# Altium footprint library 5ko.PcbLib: 126 footprints (part 6 of 8)
Each footprint in its own frame and in the unit in brackets; x right, y up, seen from the top. Pads: shape width x height; smd on the part's side, far side on the other; paste and mask are expansions set on the pad; w line width, h text height; cw(c..) or ccw(c..) is an arc to the next point about the centre after c.
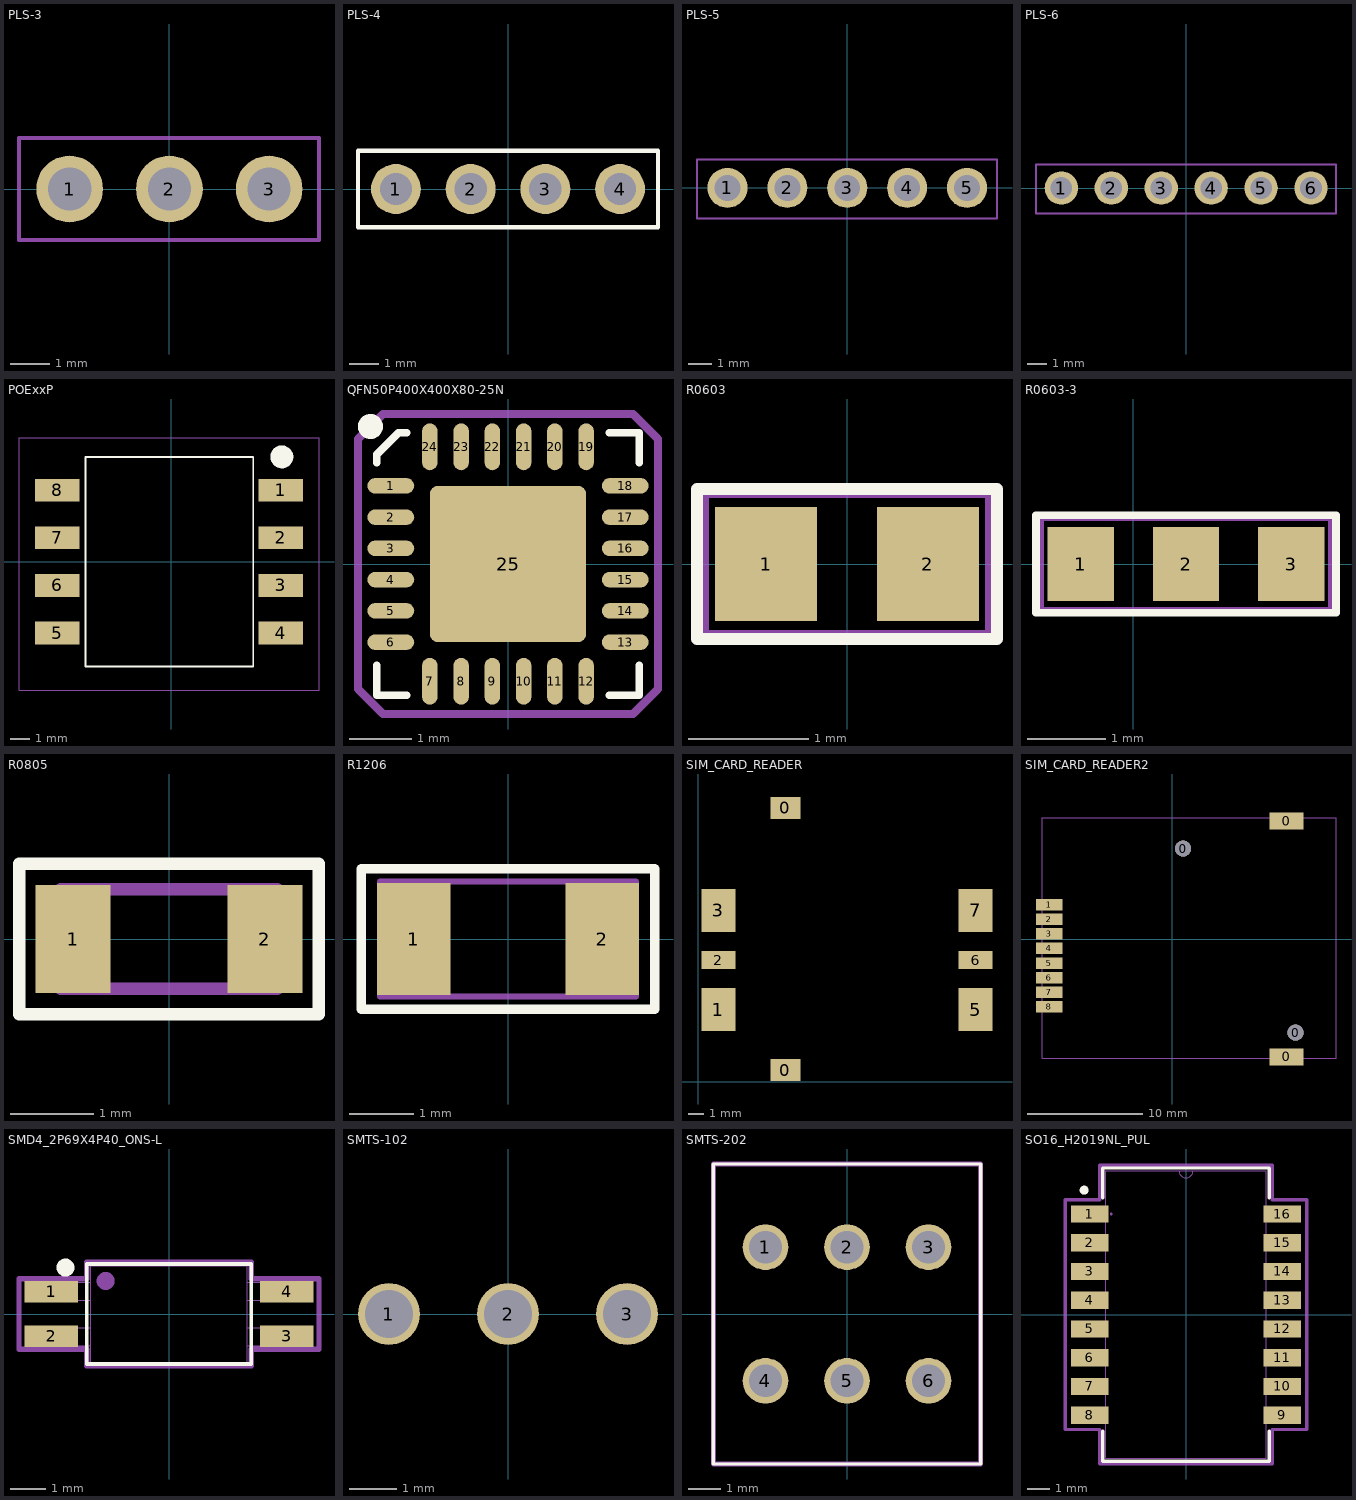
[diagram p5: the footprints below, top view; thin cyan lines are the x and y axes]

## PLS-3 [mm]
pads (3):
  round 1.7 hole 1.1: 1(-2.54,0) 2(0,0) 3(2.54,0)
Mechanical 15:
  lines w0.1: -3.83,-1.3 -3.83,1.3 3.81,1.3 3.81,-1.3 -3.83,-1.3
  text ".Designator" at -1.905,-0.127 h0.5
3D body "User Library-PLS-3.step": height 8.54, standoff -3, extent -3.81,-1.27 3.81,1.27

## PLS-4 [mm]
pads (4):
  round 1.7 hole 1.1: 1(-3.81,0) 2(-1.27,0) 3(1.27,0) 4(3.81,0)
Top Overlay:
  lines w0.15: -5.1,-1.3 5.1,-1.3 5.1,1.3 -5.1,1.3 -5.1,-1.3
Mechanical 15:
  lines w0.1: -5.1,-1.3 5.1,-1.3 5.1,1.3 -5.1,1.3 -5.1,-1.3
  text ".Designator" at -1.7,-0.1 h0.5
3D body "PLS-4.STEP": height 9.2, standoff -3.5, extent -5.08,-1.27 5.08,1.27

## PLS-5 [mm]
pads (5):
  round 1.7 hole 1.1: 1(-5.08,0) 2(-2.54,0) 3(0,0) 4(2.54,0) 5(5.08,0)
Mechanical 15:
  lines w0.1: -6.37,-1.3 -6.37,1.2 6.35,1.2 6.35,-1.3 -6.37,-1.3
  text ".Designator" at -0.889,-0.127 h0.5
3D body "User Library-PLS-5.step": height 8.54, standoff -3, extent -6.35,-1.27 6.35,1.27

## PLS-6 [mm]
pads (6):
  round 1.7 hole 1.1: 1(-6.35,0) 2(-3.81,0) 3(-1.27,0) 4(1.27,0) 5(3.81,0) 6(6.35,0)
Mechanical 15:
  lines w0.1: -7.64,-1.3 7.62,-1.3 7.62,1.2 -7.64,1.2 -7.64,-1.3
  text ".Designator" at -2.159,-0.127 h0.5
3D body "User Library-PLS-6-1.step": height 8.54, standoff -3, extent -7.62,-1.27 7.62,1.27

## POExxP [mm]
height 10
pads (8):
  rect 2.335x1.19 smd: 1(5.75,3.75) 2(5.75,1.25) 3(5.75,-1.25) 4(5.75,-3.75) 5(-6,-3.75) 6(-6,-1.25) 7(-6,1.25) 8(-6,3.75)
Top Overlay:
  circle w0.6: c5.8,5.5 r0.3
  lines w0.1: -4.5,-5.5 4.3,-5.5 4.3,5.5 -4.5,5.5 -4.5,-5.5
Mechanical 15:
  lines w0.05: -8,-6.75 -8,6.5 7.75,6.5 7.75,-6.75 -8,-6.75
3D body "Coilcraft-POE30P-50L.step": height 8.97, standoff -0.05, extent -6.6,-5.46 6.6,5.46

## QFN50P400X400X80-25N [mm] "QFN, 24-Leads with exposed die pad, Body 4.05x4.05mm (max), Pitch 0.50mm, IPC Medium Density"
height 0.8
pads (25):
  oval 0.75x0.25 smd mask+0.075: 1(-1.875,1.25) 2(-1.875,0.75) 3(-1.875,0.25) 4(-1.875,-0.25) 5(-1.875,-0.75) 6(-1.875,-1.25) 13(1.875,-1.25) 14(1.875,-0.75) 15(1.875,-0.25) 16(1.875,0.25) 17(1.875,0.75) 18(1.875,1.25)
  oval 0.25x0.75 smd mask+0.075: 7(-1.25,-1.875) 8(-0.75,-1.875) 9(-0.25,-1.875) 10(0.25,-1.875) 11(0.75,-1.875) 12(1.25,-1.875) 19(1.25,1.875) 20(0.75,1.875) 21(0.25,1.875) 22(-0.25,1.875) 23(-0.75,1.875) 24(-1.25,1.875)
  rrect10% 2.5x2.5 smd: 25(0,0)
Top Overlay:
  circle w0.2: c-2.2,2.2 r0.1
  lines w0.127: -2.1,-1.625 -2.1,-2.1 -1.625,-2.1 ; -2.1,1.625 -2.1,1.75 -1.75,2.1 -1.625,2.1 ; 1.625,-2.1 2.1,-2.1 2.1,-1.625 ; 1.625,2.1 2.1,2.1 2.1,1.625
Mechanical 15:
  lines w0.127: -2.4,-2 -2.4,2 -2,2.4 2,2.4 2.4,2 2.4,-2 2,-2.4 -2,-2.4 -2.4,-2
3D body "QFN50P400X400X80-25N.STEP": height 0.8, standoff 0, extent -2.045,-2.045 2.045,2.045

## R0603 [mm]
pads (2):
  rect 0.85x0.95 smd: 1(-0.675,0) 2(0.675,0)
Top Overlay:
  lines w0.1: -1.25,-0.625 -1.25,0.625 1.25,0.625 1.25,-0.625 -1.25,-0.625
Mechanical 15:
  lines w0.1: -1.2,-0.6 -1.2,0.6 1.2,0.6 1.2,-0.6 -1.2,-0.6
  text ".Designator" at -0.9,-0.1 h0.3
3D body "RES0603.step": height 0.45, standoff 0, extent -0.8,-0.4 0.8,0.4

## R0603-3 [mm]
pads (3):
  rect 0.85x0.95 smd: 1(-0.675,0) 2(0.675,0) 3(2.025,0)
Top Overlay:
  lines w0.1: -1.25,-0.625 -1.25,0.625 2.6,0.625 2.6,-0.625 -1.25,-0.625
Mechanical 15:
  lines w0.1: -1.2,-0.6 -1.2,0.6 2.55,0.6 2.55,-0.6 -1.2,-0.6
  text ".Designator" at 0.025,-0.1 h0.3
3D body "RES0603.step": height 0.45, standoff 0, extent -0.8,-0.4 0.8,0.4

## R0805 [mm]
height 1.45
pads (2):
  rect 0.9x1.3 smd: 1(-1.15,0) 2(1.15,0)
Top Overlay:
  lines w0.15: -1.8,-0.9 -1.8,0.9 1.8,0.9 1.8,-0.9 -1.8,-0.9
Mechanical 15:
  lines w0.15: -1.3,-0.6 1.3,-0.6 1.3,0.6 -1.3,0.6 -1.3,-0.6
  text ".Designator" at -0.9,-0.1 h0.3
3D body "User Library-User Library-0805_Res1.step": height 0.8, standoff 0, extent -1.4,-0.625 1.4,0.625

## R1206 [mm]
pads (2):
  rect 1.15x1.75 smd: 1(-1.475,0) 2(1.475,0)
Top Overlay:
  lines w0.15: -2.3,-1.1 2.3,-1.1 2.3,1.1 -2.3,1.1 -2.3,-1.1
Mechanical 15:
  lines w0.1: -2,-0.9 -2,0.9 2,0.9 2,-0.9 -2,-0.9
  text ".Designator" at -1.7,-0.1 h0.5
3D body "RES1206-2.step": height 0.55, standoff 0, extent -1.505,-0.775 1.505,0.775

## SIM_CARD_READER [mm]
pads (8):
  rect 1.95x1.45 smd: 0(5.69,0.755) 0(5.69,17.885)
  rect 2.2x2.8 smd: 1(1.31,4.705) 3(1.31,11.185) 5(18.11,4.705) 7(18.11,11.185)
  rect 2.2x1.2 smd: 2(1.31,7.945) 6(18.11,7.945)
3D body "SIM1.stp": height 1.9, standoff -0.1, extent 0.2,0.25 25.72,18.35

## SIM_CARD_READER2 [mm]
pads (12):
  round 1.4 hole 1.4 unplated: 0(0.935,7.885) 0(10.735,-8.165)
  rect 2.95x1.5 smd: 0(9.965,-10.275) 0(9.965,10.275)
  rect 2.3x1 smd: 1(-10.735,2.985) 2(-10.735,1.715) 3(-10.735,0.445) 4(-10.735,-0.825) 5(-10.735,-2.095) 6(-10.735,-3.365) 7(-10.735,-4.635) 8(-10.735,-5.905)
Mechanical 15:
  lines w0.1: -11.335,-10.415 -11.335,10.585 14.265,10.585 14.265,-10.415 -11.335,-10.415
  text ".Designator" at -0.935,-0.215 h0.5
3D body "SIM2.stp": height 1.94, standoff -0.56, extent -11.335,-10.39 15.165,10.56

## SMD4_2P69X4P40_ONS-L [mm]
height 1
pads (4):
  rect 1.5x0.6 smd paste+0 mask+0: 1(-3.3,0.625) 2(-3.3,-0.625) 3(3.3,-0.625) 4(3.3,0.625)
Top Overlay:
  circle w0.25: c-2.9,1.3 r0.125
  lines w0.1: -2.3,-1.4 -2.3,1.4 -2.2,1.4 2.3,1.4 2.3,-1.4 -2.3,-1.4
Mechanical 13:
  circle w0.25: c-1.775,0.925 r0.125
  lines w0.025: -2.197,0.381 -3.645,0.381 -3.645,0.889 -2.197,0.889 ; -3.645,-0.889 -2.197,-0.889 -2.197,-0.381 -3.645,-0.381 -3.645,-0.889 ; -2.197,-1.346 -2.197,1.346 2.197,1.346 2.197,-1.346 -2.197,-1.346 ; 2.197,-0.889 3.645,-0.889 3.645,-0.381 2.197,-0.381 2.197,-0.889 ; 2.197,0.381 3.645,0.381 3.645,0.889 2.197,0.889 2.197,0.381
Mechanical 15:
  lines w0.152: -4.2,-0.991 -2.299,-0.991 -2.299,-1.448 2.299,-1.448 2.299,-0.991 4.2,-0.991 4.2,0.991 2.299,0.991 2.299,1.448 -2.299,1.448 -2.299,0.991 -4.2,0.991 -4.2,-0.991
3D body "SMD4_2P69X4P40_ONS.step": height 2.39, standoff 0, extent -3.645,-1.346 3.645,1.346

## SMTS-102 [mm]
pads (3):
  round 1.3 hole 1 mask+0.07: 1(-2.5,0) 2(0,0) 3(2.5,0)
3D body: height 8.4, standoff 1.2, extent -3,-2.7 3,2.7
3D body: height 1.2, standoff -4.8, extent 2.25,-0.4 2.75,0.4
3D body: height 1.2, standoff -4.8, extent -2.75,-0.4 -2.25,0.4
3D body: height 1.2, standoff -4.8, extent -0.25,-0.4 0.25,0.4
3D body: height 22.9, standoff 13.29, extent -1.142,-1.25 4.965,1.25
3D body: height 14.3, standoff 8.3, extent -2.4,-2.4 2.4,2.4
3D body: height 8.3, standoff 1.2, extent -4.1,-2.6 4.1,2.6

## SMTS-202 [mm]
pads (6):
  round 1.4 hole 1 mask+0.07: 1(-2.5,2.05) 2(0,2.05) 3(2.5,2.05) 4(-2.5,-2.05) 5(0,-2.05) 6(2.5,-2.05)
Top Overlay:
  lines w0.1: -4.1,-4.6 4.1,-4.6 4.1,4.6 -4.1,4.6 -4.1,-4.6
Mechanical 15:
  lines w0.15: -4.1,-4.6 4.1,-4.6 4.1,4.6 -4.1,4.6 -4.1,-4.6
  text ".Designator" at -2.235,-0.215 h0.5
3D body: height 8.1, standoff 1, extent -4.1,-4.6 4.1,4.6
3D body: height 14.1, standoff 8.1, extent -2.5,-2.5 2.5,2.5
3D body: height 22.8, standoff 13.19, extent -1.142,-1.25 4.965,1.25
3D body: height 12.1, standoff 8.1, extent -3.5,-3.499 3.5,3.499
3D body: height 5, standoff -3, extent -2.75,-2.45 -2.25,-1.65
3D body: height 5, standoff -3, extent -0.25,-2.45 0.25,-1.65
3D body: height 5, standoff -3, extent 2.25,-2.45 2.75,-1.65
3D body: height 5, standoff -3, extent 2.25,1.65 2.75,2.45
3D body: height 5, standoff -3, extent -0.25,1.65 0.25,2.45
3D body: height 5, standoff -3, extent -2.75,1.65 -2.25,2.45
3D body: height 8.2, standoff 1, extent -3,-4.7 3,4.7
3D body: height 8.2, standoff 8, extent -4.1,-4.6 4.1,4.6

## SO16_H2019NL_PUL [mil]
pads (16):
  rect 65x30 smd paste+0 mask+0: 1(-167.5,175) 2(-167.5,125) 3(-167.5,75) 4(-167.5,25) 5(-167.5,-25) 6(-167.5,-75) 7(-167.5,-125) 8(-167.5,-175) 9(167.5,-175) 10(167.5,-125) 11(167.5,-75) 12(167.5,-25) 13(167.5,25) 14(167.5,75) 15(167.5,125) 16(167.5,175)
Top Overlay:
  circle w7.87: c-177.17,216.54 r3.94
  lines w6: -145,-203.1 -145,-255 145,-255 145,-203.1 ; -145,203.1 -145,255 145,255 145,203.1
Mechanical 13:
  circle w0: c-130,175 r1.5
  lines w0: -12,250 ccw(c0,250) 12,250
  lines w1: -140,-250 140,-250 140,250 -140,250 -140,-250
Mechanical 15:
  lines w6: -210,-200 -210,200 -150,200 -150,260 150,260 150,200 210,200 210,-200 150,-200 150,-260 -150,-260 -150,-200 -210,-200
3D body: height 10, standoff 0, extent 0,0 10,10
3D body "SO16_H2019NL_PUL.step": height 235.12, standoff 0, extent -186.22,-250 186.22,250